# Altium footprint library fszhang.PcbLib: 1032 footprints (part 54 of 66)
Each footprint in its own frame and in the unit in brackets; x right, y up, seen from the top. Pads: shape width x height; smd on the part's side, far side on the other; paste and mask are expansions set on the pad; w line width, h text height; cw(c..) or ccw(c..) is an arc to the next point about the centre after c.
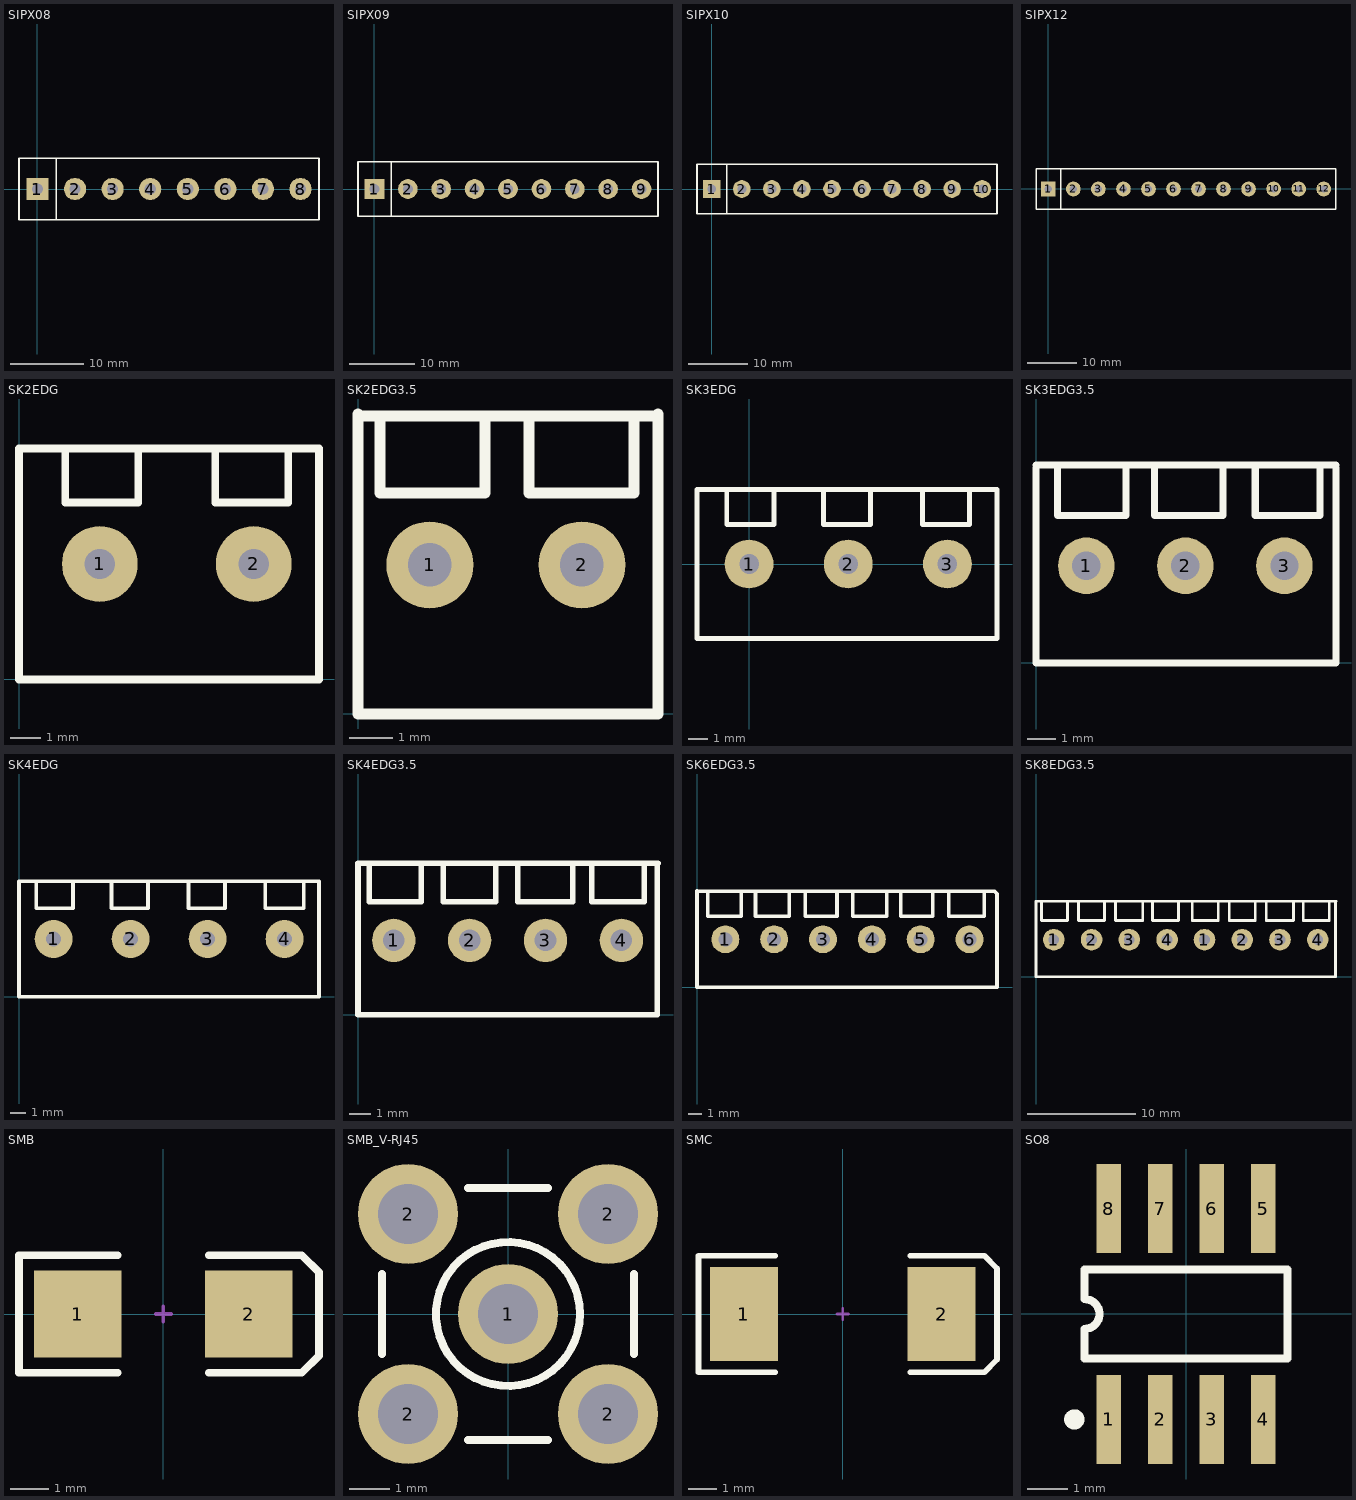
[diagram p53: the footprints below, top view; thin cyan lines are the x and y axes]

## SIPX08 [mm]
pads (8):
  rect 3x3 hole 1.5: 1(0,0)
  round 3 hole 1.5: 2(5.08,0) 3(10.16,0) 4(15.24,0) 5(20.32,0) 6(25.4,0) 7(30.48,0) 8(35.56,0)
Top Overlay:
  lines w0.254: 2.54,-4.15 2.54,4.15 ; -2.5,-4.15 -2.5,4.15 38.06,4.15 38.06,-4.15 -2.5,-4.15

## SIPX09 [mm]
pads (9):
  rect 3x3 hole 1.5: 1(0,0)
  round 3 hole 1.5: 2(5.08,0) 3(10.16,0) 4(15.24,0) 5(20.32,0) 6(25.4,0) 7(30.48,0) 8(35.56,0) 9(40.64,0)
Top Overlay:
  lines w0.254: 2.54,-4.15 2.54,4.15 ; -2.5,-4.15 43.14,-4.15 43.14,4.15 -2.5,4.15 -2.5,-4.15

## SIPX10 [mm]
pads (10):
  rect 3x3 hole 1.5: 1(0,0)
  round 3 hole 1.5: 2(5.08,0) 3(10.16,0) 4(15.24,0) 5(20.32,0) 6(25.4,0) 7(30.48,0) 8(35.56,0) 9(40.64,0) 10(45.72,0)
Top Overlay:
  lines w0.254: 2.54,-4.15 2.54,4.15 ; -2.5,-4.15 -2.5,4.15 48.22,4.15 48.22,-4.15 -2.5,-4.15

## SIPX12 [mm]
pads (12):
  rect 3x3 hole 1.5: 1(0,0)
  round 3 hole 1.5: 2(5.08,0) 3(10.16,0) 4(15.24,0) 5(20.32,0) 6(25.4,0) 7(30.48,0) 8(35.56,0) 9(40.64,0) 10(45.72,0) 11(50.8,0) 12(55.88,0)
Top Overlay:
  lines w0.254: 2.54,-4.15 2.54,4.15 ; -2.5,-4.15 -2.5,4.15 58.38,4.15 58.38,-4.15 -2.5,-4.15

## SK2EDG [mm] "小型插接件5.08"
pads (2):
  round 2.5 hole 1: 1(2.667,3.81) 2(7.747,3.81)
Top Overlay:
  lines w0.254: 1.524,7.62 1.524,5.842 3.937,5.842 3.937,7.62 ; 6.477,7.62 6.477,5.842 8.89,5.842 8.89,7.62 ; 0,0 0,7.62 9.9,7.62 9.9,0 0,0

## SK2EDG3.5 [mm] "3.5"
pads (2):
  round 2 hole 1: 1(1.651,3.429) 2(5.151,3.429)
Top Overlay:
  lines w0.254: 0,6.858 6.9,6.858 ; 0,6.9 0,0 6.9,0 6.9,6.9 ; 0.508,6.858 0.508,5.08 2.921,5.08 2.921,6.858 ; 3.937,6.858 3.937,5.08 6.35,5.08 6.35,6.858

## SK3EDG [mm] "小型插接件5.08"
pads (3):
  round 2.5 hole 1: 1(0,0) 2(5.08,0) 3(10.16,0)
Top Overlay:
  lines w0.254: -1.143,3.81 -1.143,2.032 1.27,2.032 1.27,3.81 ; 3.81,3.81 3.81,2.032 6.223,2.032 6.223,3.81 ; 8.89,3.81 8.89,2.032 11.303,2.032 11.303,3.81 ; -2.667,-3.81 12.7,-3.81 12.7,3.81 -2.667,3.81 -2.667,-3.81

## SK3EDG3.5 [mm] "3.5"
pads (3):
  round 2 hole 1: 1(1.778,3.429) 2(5.278,3.429) 3(8.778,3.429)
Top Overlay:
  lines w0.254: 0,6.9 0,0 10.6,0 10.6,6.9 ; 0,6.985 10.6,6.985 ; 0.762,6.985 0.762,5.207 3.175,5.207 3.175,6.985 ; 4.191,6.985 4.191,5.207 6.604,5.207 6.604,6.985 ; 7.747,6.985 7.747,5.207 10.033,5.207 10.033,6.985

## SK4EDG [mm] "5.08"
pads (4):
  round 2.5 hole 1: 1(2.286,3.81) 2(7.366,3.81) 3(12.446,3.81) 4(17.526,3.81)
Top Overlay:
  lines w0.254: 1.143,7.62 1.143,5.842 3.556,5.842 3.556,7.62 ; 6.096,7.62 6.096,5.842 8.509,5.842 8.509,7.62 ; 11.176,7.62 11.176,5.842 13.589,5.842 13.589,7.62 ; 16.256,7.62 16.256,5.842 18.796,5.842 18.796,7.62 ; 0,0 10.414,0 19.8,0 19.8,7.62 10.414,7.62 0,7.62 0,0

## SK4EDG3.5 [mm] "3.5"
pads (4):
  round 2 hole 1: 1(1.651,3.429) 2(5.151,3.429) 3(8.651,3.429) 4(12.151,3.429)
Top Overlay:
  lines w0.254: 0,6.9 0,0 9.398,0 13.716,0 ; 0,6.985 9.398,6.985 13.843,6.985 ; 0.508,6.985 0.508,5.207 2.921,5.207 2.921,6.985 ; 3.937,6.985 3.937,5.207 6.35,5.207 6.35,6.985 ; 7.366,6.985 7.366,5.207 9.906,5.207 9.906,6.985 ; 10.795,6.985 10.795,5.207 13.208,5.207 13.208,6.985 ; 13.8,0 13.8,6.9

## SK6EDG3.5 [mm] "3.5"
pads (6):
  round 2 hole 1: 1(2.032,3.429) 2(5.532,3.429) 3(9.032,3.429) 4(12.532,3.429) 5(16.032,3.429) 6(19.532,3.429)
Top Overlay:
  lines w0.254: 0,6.858 9.652,6.858 21.336,6.858 21.5,6.694 21.5,0 ; 0,6.9 0,0 10.414,0 21.463,0 ; 0.762,6.858 0.762,5.08 3.175,5.08 3.175,6.858 ; 4.191,6.858 4.191,5.08 6.604,5.08 6.604,6.858 ; 7.747,6.858 7.747,5.08 10.033,5.08 10.033,6.858 ; 11.176,6.858 11.176,5.08 13.589,5.08 13.589,6.858 ; 14.605,6.858 14.605,5.08 16.891,5.08 16.891,6.858 ; 18.034,6.858 18.034,5.08 20.574,5.08 20.574,6.858

## SK8EDG3.5 [mm] "3.5"
pads (8):
  round 2 hole 1: 1(1.651,3.429) 1(15.621,3.429) 2(5.151,3.429) 2(19.121,3.429) 3(8.651,3.429) 3(22.621,3.429) 4(12.151,3.429) 4(26.121,3.429)
Top Overlay:
  lines w0.254: 0,6.9 0,0 9.398,0 14.224,0 ; 0,6.985 9.398,6.985 14.351,6.985 ; 0.508,6.985 0.508,5.207 2.921,5.207 2.921,6.985 ; 3.937,6.985 3.937,5.207 6.35,5.207 6.35,6.985 ; 7.366,6.985 7.366,5.207 9.906,5.207 9.906,6.985 ; 10.795,6.985 10.795,5.207 13.208,5.207 13.208,6.985 ; 13.97,0 23.368,0 27.686,0 ; 13.97,6.985 23.368,6.985 27.813,6.985 ; 14.478,6.985 14.478,5.207 16.891,5.207 16.891,6.985 ; 17.907,6.985 17.907,5.207 20.32,5.207 20.32,6.985 ; 21.336,6.985 21.336,5.207 23.876,5.207 23.876,6.985 ; 24.765,6.985 24.765,5.207 27.178,5.207 27.178,6.985 ; 27.77,0 27.77,6.9

## SMB [mm] "DO-214-AA/SMB; 2 C-Bend Leads; Body 5.3 x 3.6 mm, inc. leads (LxW)"
height 2.54
pads (2):
  rect 2.3x2.3 smd: 1(-2.25,0) 2(2.25,0)
Top Overlay:
  lines w0.2: -1.2,-1.55 -3.8,-1.55 -3.8,1.55 -1.2,1.55 ; 1.2,-1.55 3.65,-1.55 4.1,-1.1 4.1,1.1 3.65,1.55 1.2,1.55
Mechanical 1:
  lines w0.1: -0.2,0 0.2,0 ; 0,-0.2 0,0.2

## SMB_V-RJ45 [mm] "Connector; SMB Straight"
pads (5):
  round 2.5 hole 1.5: 1(0,0) 2(-2.5,-2.5) 2(-2.5,2.5) 2(2.5,-2.5) 2(2.5,2.5)
Top Overlay:
  circle w0.2: c0,0 r1.8
  lines w0.2: -3.15,-1 -3.15,1 ; -1,-3.15 1,-3.15 ; -1,3.15 1,3.15 ; 3.15,-1 3.15,1
Mechanical 1:
  circle w0.025: c0,0 r0.2
  circle w0.025: c0,0 r1.05
  circle w0.025: c0,0 r1.8

## SMC [mm] "DO-214-AB/SMC; 2 C-Bend Leads; Body 7.9 x 5.9 mm, inc. leads (LxW)"
height 2.65
pads (2):
  rect 2.4x3.3 smd: 1(-3.475,0) 2(3.475,0)
Top Overlay:
  lines w0.2: -2.375,-2.05 -5.075,-2.05 -5.075,2.05 -2.375,2.05 ; 2.375,-2.05 4.975,-2.05 5.425,-1.6 5.425,1.6 4.975,2.055 ; 2.375,2.05 4.975,2.05
Mechanical 1:
  lines w0.1: -0.2,0 0.2,0 ; 0,-0.2 0,0.2

## SO8 [mm] "Small Outline; 8 Leads; Body Width 3.9 mm; Pitch 1.27 mm"
height 1.75
pads (8):
  rect 0.6x2.2 smd: 1(-1.905,-2.6) 2(-0.635,-2.6) 3(0.635,-2.6) 4(1.905,-2.6) 5(1.905,2.6) 6(0.635,2.6) 7(-0.635,2.6) 8(-1.905,2.6)
Top Overlay:
  circle w0.25: c-2.755,-2.6 r0.125
  lines w0.2: -2.5,-1.1 2.5,-1.1 2.5,1.1 -2.5,1.1 -2.5,0.367 cw(c-2.5,0) -2.5,-0.367 -2.5,-1.1